# Altium footprint library 20210518.PcbLib: 414 footprints (part 12 of 26)
Each footprint in its own frame and in the unit in brackets; x right, y up, seen from the top. Pads: shape width x height; smd on the part's side, far side on the other; paste and mask are expansions set on the pad; w line width, h text height; cw(c..) or ccw(c..) is an arc to the next point about the centre after c.
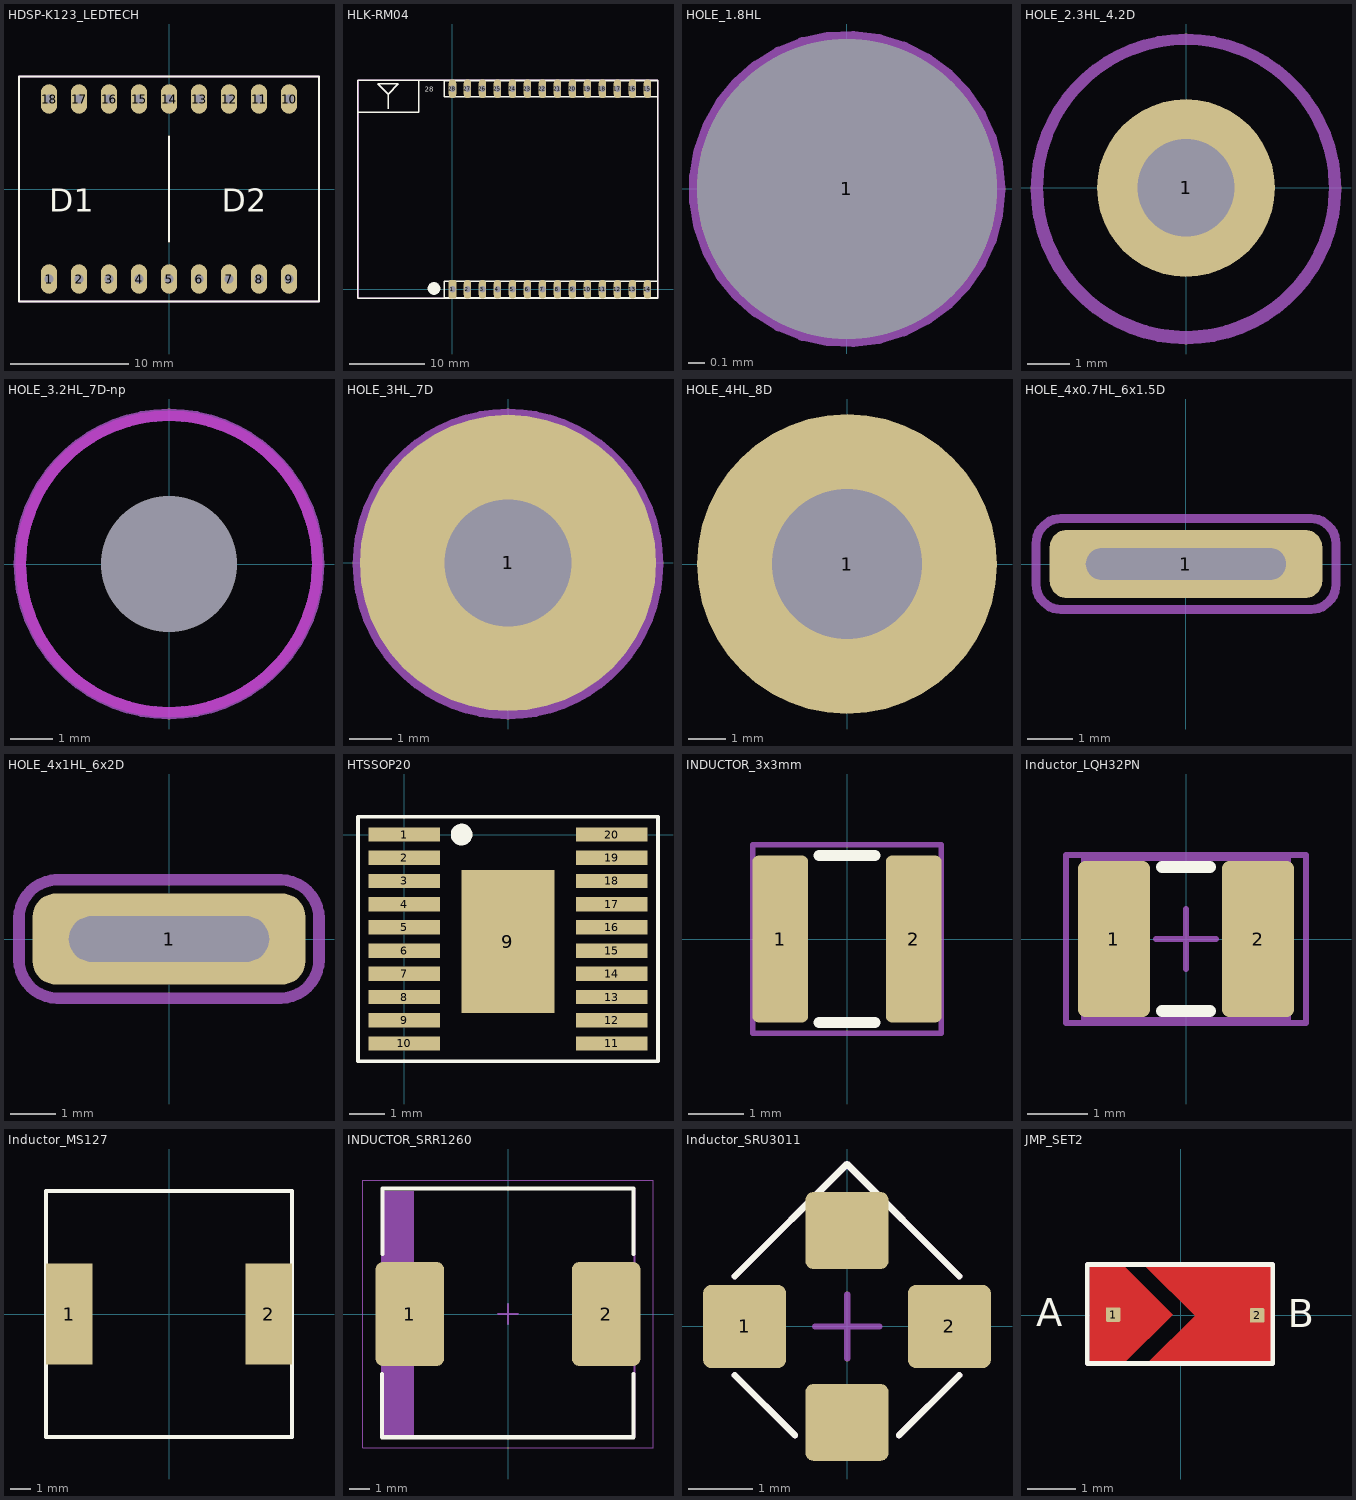
[diagram p11: the footprints below, top view; thin cyan lines are the x and y axes]

## HDSP-K123_LEDTECH [mil]
pads (18):
  oval 54x98.43 hole 31: 1(-400,-300) 2(-300,-300) 3(-200,-300) 4(-100,-300) 5(0,-300) 6(100,-300) 7(200,-300) 8(300,-300) 9(400,-300) 10(400,300) 11(300,300) 12(200,300) 13(100,300) 14(0,300) 15(-100,300) 16(-200,300) 17(-300,300) 18(-400,300)
Top Overlay:
  lines w8: 0,-175 0,175 ; -500,-375 500,-375 500,375 -500,375 -500,-375
  text "D1" at -400,-100 h131.25
  text "D2" at 175,-100 h131.25
Bottom Overlay:
  lines w8: 0,-175 0,175 ; -500,-375 500,-375 500,375 -500,375 -500,-375
  text "e" at 16.73,-233.27 h56.25
  text "dp" at -62.52,-225 h56.25
  text "c" at -187.52,-225 h56.25
  text "d" at -287.52,-225 h56.25
  text "e" at -383.35,-225 h56.25
  text "b" at 412.48,150 h56.25
  text "a" at 316.65,150 h56.25
  text "f" at 208.32,150 h56.25
  text "+" at 47.47,176.67 h56.25
  text "+" at -52.53,176.67 h56.25
  text "b" at -87.52,150 h56.25
  text "a" at -183.35,150 h56.25
  text "g" at -287.52,150 h56.25
  text "f" at -370.83,150 h56.25
  text "D2" at 379.72,-100 h131.25
  text "D1" at -214.73,-100 h131.25
  text "g" at 212.48,-225 h56.25
  text "c" at 312.48,-225 h56.25
  text "dp" at 462.48,-225 h56.25
  text "d" at 112.48,-225 h56.25
Mechanical 13:
  lines w8: -500,-375 -500,375 500,375 500,-375 -500,-375
Mechanical 15:
  lines w3.94: -499.02,-364.17 -499.02,374.02 500,374.02 500,-374.02 -499.02,-374.02 -499.02,-359.25
3D body: height 318.9, standoff -196.85, extent -494.1,-375.98 501.97,368.11

## HLK-RM04 [mm]
pads (28):
  rrect50% 1x2.5 hole 0.85: 1(0,0)
  oval 1x2.5 hole 0.85: 2(2,0) 3(4,0) 4(6,0) 5(8,0) 6(10,0) 7(12,0) 8(14,0) 9(16,0) 10(18,0) 11(20,0) 12(22,0) 13(24,0) 14(26,0) 15(26,26.75) 16(24,26.75) 17(22,26.75) 18(20,26.75) 19(18,26.75) 20(16,26.75) 21(14,26.75) 22(12,26.75) 23(10,26.75) 24(8,26.75) 25(6,26.75) 26(4,26.75) 27(2,26.75) 28(0,26.75)
Top Overlay:
  lines w0.2: -12.6,23.6 -4.5,23.6 -4.5,27.8 ; -8.6,24.1 -8.6,26 ; 27.4,-1.1 -1.1,-1.1 -1.1,1.1 27.4,1.1 ; 27.4,25.8 27.4,-1.2 -12.6,-1.2 -12.6,27.9 27.4,27.9 27.4,25.7 -1.1,25.7 -1.1,27.8 27.4,27.8 ; -8.6,26 -10,27.4 -7.2,27.4 -8.6,26
  lines w0.9: -2.071,0.187 ccw(c-2.464,0.114) -2.064,0.114
  text "28" at -3.7,26.1 h1.2
Mechanical 15:
  lines w0.2: -12.6,-1.2 27.4,-1.2 27.4,25.5 27.4,27.9 -12.6,27.9 -12.6,-1.2
3D body: height 5.6, standoff -6.4, extent -12.6,-1.1 27.4,27.9

## HOLE_1.8HL [mm] "Hole, 1mm hole,"
pads (1):
  round 1.8 hole 1.8 mask+0: 1(0,0)
Mechanical 13:
  circle w0.1: c0,0 r0.9
Mechanical 15:
  circle w0.1: c0,0 r0.9

## HOLE_2.3HL_4.2D [mm] "Hole, 2.3mm hole, 4.2mm total dimention with copper"
pads (1):
  round 4.2 hole 2.3: 1(0,0)
Mechanical 13:
  circle w0.254: c0,0 r3.5
Mechanical 15:
  circle w0.254: c0,-0.025 r3.542

## HOLE_3.2HL_7D-np [mm] "Hole, 3mm hole, 7mm total non plated"
pads (1):
  round 0 hole 3.2 unplated: 1(0,0)
Keep-Out Layer:
  circle w0.254: c0,0 r3.501
Mechanical 13:
  circle w0.254: c0,0 r3.5
Mechanical 15:
  circle w0.254: c0,0 r3.542

## HOLE_3HL_7D [mm] "Hole, 3mm hole, 7mm total dimention with copper"
pads (1):
  round 7 hole 3: 1(0,0)
Mechanical 13:
  circle w0.254: c0,0 r3.5
Mechanical 15:
  circle w0.254: c0,-0.025 r3.542

## HOLE_4HL_8D [mm] "Hole, 3mm hole, 7mm total dimention with copper"
pads (1):
  round 8 hole 4: 1(0,0)
Mechanical 13:
  circle w0.254: c0,0 r3.5
Mechanical 15:
  circle w0.254: c0,-0.025 r3.542

## HOLE_4x0.7HL_6x1.5D [mm] "Hole, 4x1mm hole, 6x2mm total dimention with copper"
pads (1):
  rrect50% 6x1.5 hole 0.7 slot 4.4 at 0 deg: 1(0,0)
Mechanical 13:
  lines w0.2: -3.3,-0.45 ccw(c-2.75,-0.45) -2.75,-1 2.75,-1 ccw(c2.75,-0.45) 3.3,-0.45 3.3,0.45 ccw(c2.75,0.45) 2.75,1 -2.75,1 ccw(c-2.75,0.45) -3.3,0.45 -3.3,-0.45
Mechanical 15:
  lines w0.2: -3.3,-0.45 ccw(c-2.75,-0.45) -2.75,-1 2.75,-1 ccw(c2.75,-0.45) 3.3,-0.45 3.3,0.45 ccw(c2.75,0.45) 2.75,1 -2.75,1 ccw(c-2.75,0.45) -3.3,0.45 -3.3,-0.45

## HOLE_4x1HL_6x2D [mm] "Hole, 4x1mm hole, 6x2mm total dimention with copper"
pads (1):
  rrect50% 6x2 hole 1 slot 4.4 at 0 deg: 1(0,0)
Mechanical 13:
  lines w0.254: -2.5,1.3 2.4,1.3 ; -2.454,-1.3 cw(c-2.454,-0.454) -3.3,-0.454 -3.3,0.454 cw(c-2.454,0.454) -2.454,1.3 ; -2.4,-1.3 2.4,-1.3 ; 2.454,-1.3 ccw(c2.454,-0.454) 3.3,-0.454 3.3,0.454 ccw(c2.454,0.454) 2.454,1.3
Mechanical 15:
  lines w0.254: -2.454,-1.3 cw(c-2.454,-0.454) -3.3,-0.454 -3.3,0.454 cw(c-2.454,0.454) -2.454,1.3 ; -2.4,-1.3 2.4,-1.3 ; -2.4,1.3 2.4,1.3 ; 2.454,-1.3 ccw(c2.454,-0.454) 3.3,-0.454 3.3,0.454 ; 2.454,1.3 cw(c2.454,0.454) 3.3,0.454 ; 2.454,1.3 cw(c2.454,0.454) 3.3,0.454 ; 2.454,1.3 cw(c2.454,0.454) 3.3,0.454 ; 2.454,1.3 cw(c2.454,0.454) 3.3,0.454

## HTSSOP20 [mm] "PowerPAD Plastic Small"
height 1.2
pads (21):
  rect 2x0.4 smd: 1(0,0) 2(0,-0.65) 3(0,-1.3) 4(0,-1.95) 5(0,-2.6) 6(0,-3.25) 7(0,-3.9) 8(0,-4.55) 9(0,-5.2) 10(0,-5.85) 11(5.8,-5.85) 12(5.8,-5.2) 13(5.8,-4.55) 14(5.8,-3.9) 15(5.8,-3.25) 16(5.8,-2.6) 17(5.8,-1.95) 18(5.8,-1.3) 19(5.8,-0.65) 20(5.8,0)
  rect 2.6x4 smd: 9(2.9,-3)
Top Overlay:
  circle w0.3: c1.6,0 r0.153
  lines w0.1: -1.3,-6.35 -1.3,0.5 7.1,0.5 7.1,-6.35 -1.3,-6.35
3D body: height 0.95, standoff -0.06, extent -0.31,-6.17 6.104,0.33

## INDUCTOR_3x3mm [mm]
pads (2):
  rrect20% 1x3 smd: 1(-1.2,0) 2(1.2,0)
Top Overlay:
  lines w0.2: -0.5,-1.5 0.5,-1.5 ; -0.5,1.5 0.5,1.5
Mechanical 15:
  lines w0.1: -1.7,-1.7 1.7,-1.7 1.7,1.7 -1.7,1.7 -1.7,-1.7

## Inductor_LQH32PN [mm] "Inductor Murata_1210"
height 2.2
pads (2):
  rrect20% 1.2x2.6 smd: 1(-1.2,0) 2(1.2,0)
Top Overlay:
  lines w0.2: -0.4,-1.2 0.4,-1.2 ; -0.4,1.2 0.4,1.2
Mechanical 13:
  lines w0.1: -1.7,-1.35 1.7,-1.35 1.7,1.35 -1.7,1.35 -1.7,-1.35
Mechanical 15:
  lines w0.1: -0.5,0 0.5,0 ; 0,-0.5 0,0.5 ; -2,-1.4 2,-1.4 2,1.4 -2,1.4 -2,-1.4
3D body: height 1.55, standoff 0, extent -1.6,-1.275 1.6,1.225

## Inductor_MS127 [mm]
pads (2):
  rect 2.3x5 smd: 1(-4.95,0) 2(4.95,0)
Top Overlay:
  lines w0.2: -6.1,-6.1 6.1,-6.1 6.1,6.1 -6.1,6.1 -6.1,-6.1
3D body: height 10.16, standoff -0.04, extent -6.125,-6.25 6.175,6.05

## INDUCTOR_SRR1260 [mm] "Precision Wire Wound Inductor, 2-Leads, Body 12,50x12,50mm, IPC Medium Density"
height 6.5
pads (2):
  rrect20% 3.4x5.15 smd: 1(-4.875,0) 2(4.875,0)
Top Overlay:
  lines w0.2: -6.248,-2.975 -6.248,-6.121 6.223,-6.121 6.223,-2.975 ; -6.223,2.975 -6.223,6.223 6.223,6.223 6.223,2.975
Mechanical 13:
  rectangle: -6.248,-6.071 -4.678,6.121
  lines w0.1: -6.248,-6.096 6.274,-6.096 6.274,6.198 -6.248,6.198 -6.248,-6.096
Mechanical 15:
  lines w0.05: -7.225,-6.65 7.225,-6.65 7.225,6.65 -7.225,6.65 -7.225,-6.65
  lines w0.1: -0.5,0 0.5,0 ; 0,-0.5 0,0.5
3D body: height 6.29, standoff 0, extent -6.25,-6.25 6.25,6.25

## Inductor_SRU3011 [mm] "SODFL, 2-Leads, IPC Medium Density"
height 1.14
pads (4):
  rrect20% 1.3x1.3 smd: 1(-1.6,0) 2(1.6,0)
  rrect20% 1.3x1.2 smd: ""(0,-1.5) ""(0,1.5)
Top Overlay:
  lines w0.1: -1.753,-0.762 -0.813,-1.702 ; -1.753,0.787 0,2.54 1.753,0.787 ; 0.813,-1.702 1.753,-0.762
Mechanical 13:
  lines w0.1: -1.753,-0.762 -0.813,-1.702 ; -1.753,0.787 0,2.54 1.753,0.787 ; 0.813,-1.702 1.753,-0.762
Mechanical 15:
  lines w0.1: -1.753,-0.762 -0.813,-1.702 ; -1.753,0.787 0,2.54 1.753,0.787 ; -0.494,0 0.506,0 ; 0.006,-0.5 0.006,0.5 ; 0.813,-1.702 1.753,-0.762
3D body: height 1.06, standoff -0.05, extent -1.9,-1.9 1.9,2.45

## JMP_SET2 [mm] "Jumper 2pin; setting jumper"
pads (2):
  rrect20% 0.3x0.3 smd: 1(-1.4,0.012) 2(1.588,0)
Top Layer:
  region: -0.712,1 1.888,1 1.888,-1 -0.688,-1 0.3,-0.012
  region: -1.887,1 -1.887,-1 -1.175,-1 -0.163,0.012 -1.15,1
Top Overlay:
  lines w0.1: -1.937,-1 -1.937,1.05 1.913,1.05 1.913,-1 -1.937,-1
  text "B" at 2.225,-0.45 h1
  text "A" at -3,-0.425 h1
Top Solder:
  region: -0.712,1 1.888,1 1.888,-1 -0.688,-1 0.3,-0.012
  region: -1.887,1 -1.887,-1 -1.175,-1 -0.163,0.012 -1.15,1
Mechanical 13:
  lines w0.1: -1.937,-1 -1.937,1.05 1.913,1.05 1.913,-1 -1.937,-1
Mechanical 15:
  lines w0.1: -1.937,-1 -1.937,1.05 1.913,1.05 1.913,-1 -1.937,-1